# Altium footprint library mastermind.PCBLIB: 1061 footprints (part 65 of 67)
Each footprint in its own frame and in the unit in brackets; x right, y up, seen from the top. Pads: shape width x height; smd on the part's side, far side on the other; paste and mask are expansions set on the pad; w line width, h text height; cw(c..) or ccw(c..) is an arc to the next point about the centre after c.
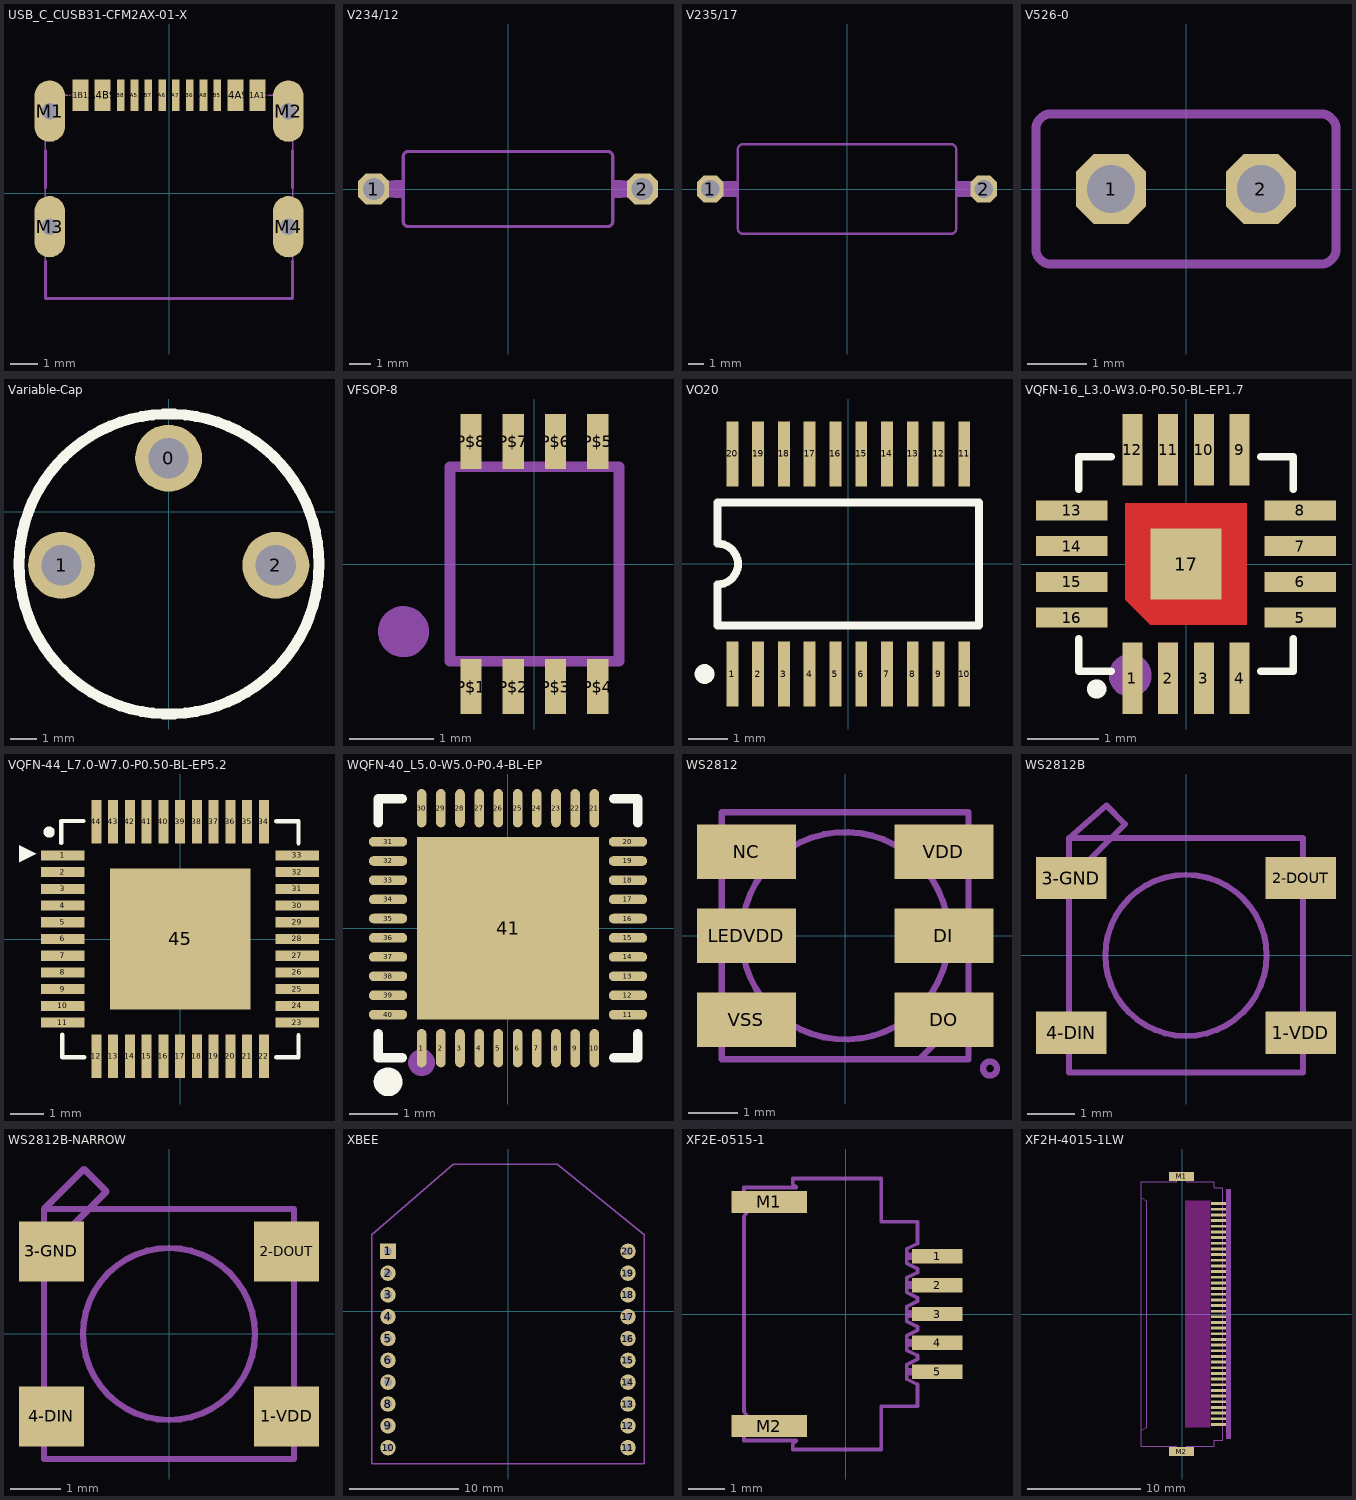
[diagram p64: the footprints below, top view; thin cyan lines are the x and y axes]

## USB_C_CUSB31-CFM2AX-01-X [mm] "USB_C_CUSB31-CFM2AX-01-X"
pads (16):
  rect 0.575x1.15 smd: A1B12(-3.2,3.545) A4B9(-2.4,3.545) B1A12(3.2,3.545) B4A9(2.4,3.545)
  rect 0.275x1.15 smd: A5(-1.25,3.545) A6(-0.25,3.545) A7(0.25,3.545) A8(1.25,3.545) B5(1.75,3.545) B6(0.75,3.545) B7(-0.75,3.545) B8(-1.75,3.545)
  oval 1.108x2.216 hole 0.6: M1(-4.32,2.97) M2(4.32,2.97) M3(-4.32,-1.21) M4(4.32,-1.21)
Top Paste:
  region: -4.826,2.489 -4.826,3.454 -4.826,3.555 -4.749,3.742 -4.606,3.885 -4.419,3.962 -4.318,3.962 -4.222,3.962 -4.045,3.889 -3.909,3.753 -3.835,3.576 -3.835,3.48 -3.835,2.464 -3.835,2.368 -3.909,2.19 -4.045,2.055 -4.222,1.981 -4.318,1.981 -4.419,1.981 -4.606,2.059 -4.749,2.201 -4.826,2.388
  region: 3.823,2.502 3.823,3.467 3.823,3.568 3.9,3.755 4.043,3.898 4.23,3.975 4.331,3.975 4.427,3.975 4.604,3.902 4.74,3.766 4.813,3.588 4.813,3.492 4.813,2.476 4.813,2.381 4.74,2.203 4.604,2.067 4.427,1.994 4.331,1.994 4.23,1.994 4.043,2.071 3.9,2.214 3.823,2.401
  region: 3.823,-1.689 3.823,-0.724 3.823,-0.623 3.9,-0.436 4.043,-0.293 4.23,-0.216 4.331,-0.216 4.427,-0.216 4.604,-0.289 4.74,-0.425 4.813,-0.603 4.813,-0.699 4.813,-1.714 4.813,-1.81 4.74,-1.988 4.604,-2.124 4.427,-2.197 4.331,-2.197 4.23,-2.197 4.043,-2.12 3.9,-1.977 3.823,-1.79
  region: -4.813,-1.689 -4.813,-0.724 -4.813,-0.623 -4.736,-0.436 -4.593,-0.293 -4.406,-0.216 -4.305,-0.216 -4.209,-0.216 -4.032,-0.289 -3.896,-0.425 -3.823,-0.603 -3.823,-0.699 -3.823,-1.714 -3.823,-1.81 -3.896,-1.988 -4.032,-2.124 -4.209,-2.197 -4.305,-2.197 -4.406,-2.197 -4.593,-2.12 -4.736,-1.977 -4.813,-1.79
Mechanical 3:
  lines w0.05: -3.53,3.54 -4.47,3.54 -4.47,-3.81 4.47,-3.81 4.47,3.54 3.53,3.54
Dimensions:
  lines w0.102: -4.47,-2.46 -4.47,-3.81 4.47,-3.81 4.47,-2.46 ; -4.47,0.19 -4.47,1.54 ; 4.47,0.19 4.47,1.54
Route Tool Path (Mech28):
  lines w0: -4.62,-1.51 ccw(c-4.32,-1.51) -4.32,-1.81 ccw(c-4.32,-1.51) -4.02,-1.51 -4.02,-0.91 ccw(c-4.32,-0.91) -4.32,-0.61 ccw(c-4.32,-0.91) -4.62,-0.91 -4.62,-1.51 ; -4.62,2.42 ccw(c-4.32,2.42) -4.32,2.12 ccw(c-4.32,2.42) -4.02,2.42 -4.02,3.52 ccw(c-4.32,3.52) -4.32,3.82 ccw(c-4.32,3.52) -4.62,3.52 -4.62,2.42 ; 4.02,-1.51 ccw(c4.32,-1.51) 4.32,-1.81 ccw(c4.32,-1.51) 4.62,-1.51 4.62,-0.91 ccw(c4.32,-0.91) 4.32,-0.61 ccw(c4.32,-0.91) 4.02,-0.91 4.02,-1.51 ; 4.02,2.42 ccw(c4.32,2.42) 4.32,2.12 ccw(c4.32,2.42) 4.62,2.42 4.62,3.52 ccw(c4.32,3.52) 4.32,3.82 ccw(c4.32,3.52) 4.02,3.52 4.02,2.42
3D body "USB Type C Port (SMD Type).STEP": height 3.18, standoff -1.02, extent -4.45,-3.8 4.49,4.1

## V234/12 [mil]
pads (2):
  oct 58.09x58.09 hole 40: 1(-250,0) 2(250,0)
Mechanical 2:
  region: -213,-16 -213,16 -195,16 -195,-16
  region: 195,-16 195,16 213,16 213,-16
  lines w6: -195,-60 ccw(c-185,-60) -185,-70 185,-70 ccw(c185,-60) 195,-60 195,60 ccw(c185,60) 185,70 -185,70 ccw(c-185,60) -195,60 -195,-60
Mechanical 8:
  lines w32: -250,0 -215,0 ; 215,0 250,0

## V235/17 [mil]
pads (2):
  oct 68.26x68.26 hole 47: 1(-350,0) 2(350,0)
Mechanical 2:
  region: -305,-20 -305,20 -280,20 -280,-20
  region: 280,-20 280,20 305,20 305,-20
  lines w6: -280,-100 ccw(c-265,-100) -265,-115 265,-115 ccw(c265,-100) 280,-100 280,100 ccw(c265,100) 265,115 -265,115 ccw(c-265,100) -280,100 -280,-100
Mechanical 8:
  lines w40: -350,0 -310,0 ; 310,0 350,0

## V526-0 [mil]
pads (2):
  oct 46.48x46.48 hole 32: 1(-50,0) 2(50,0)
Mechanical 2:
  lines w6: -100,-40 ccw(c-90,-40) -90,-50 90,-50 ccw(c90,-40) 100,-40 100,40 ccw(c90,40) 90,50 -90,50 ccw(c-90,40) -100,40 -100,-40

## Variable-Cap [mm]
pads (3):
  round 2.5 hole 1.5: 0(0,2) 1(-4,-2) 2(4,-2)
Top Overlay:
  circle w0.4: c0.013,-1.951 r5.6
3D body "User Library-spectrol pot-1.step": height 25.76, standoff -3.69, extent -6.352,-8.34 6.379,4.391

## VFSOP-8 [mm]
pads (8):
  rect 0.25x0.65 smd: P$1(-0.75,-1.45) P$2(-0.25,-1.45) P$3(0.25,-1.45) P$4(0.75,-1.45) P$5(0.75,1.45) P$6(0.25,1.45) P$7(-0.25,1.45) P$8(-0.75,1.45)
Mechanical 2:
  circle w0.305: c-1.55,-0.8 r0.15
  lines w0.127: -1,-1.15 -1,1.15 ; 1,-1.15 1,1.15
Mechanical 8:
  region: -0.85,1.15 -0.85,1.55 -0.65,1.55 -0.65,1.15
  region: -0.35,1.15 -0.35,1.55 -0.15,1.55 -0.15,1.15
  region: 0.15,1.15 0.15,1.55 0.35,1.55 0.35,1.15
  region: 0.65,1.15 0.65,1.55 0.85,1.55 0.85,1.15
  region: 0.65,-1.55 0.65,-1.15 0.85,-1.15 0.85,-1.55
  region: 0.15,-1.55 0.15,-1.15 0.35,-1.15 0.35,-1.55
  region: -0.85,-1.55 -0.85,-1.15 -0.65,-1.15 -0.65,-1.55
  region: -0.35,-1.55 -0.35,-1.15 -0.15,-1.15 -0.15,-1.55
  lines w0.127: -1,-1.15 -1,1.15 1,1.15 1,-1.15 -1,-1.15

## VO20 [mm]
pads (20):
  rect 0.3x1.65 smd: 1(-2.929,-2.778) 2(-2.279,-2.778) 3(-1.629,-2.778) 4(-0.979,-2.778) 5(-0.329,-2.778) 6(0.321,-2.778) 7(0.971,-2.778) 8(1.621,-2.778) 9(2.271,-2.778) 10(2.921,-2.778) 11(2.921,2.772) 12(2.271,2.772) 13(1.621,2.772) 14(0.971,2.772) 15(0.321,2.772) 16(-0.329,2.772) 17(-0.979,2.772) 18(-1.629,2.772) 19(-2.279,2.772) 20(-2.929,2.772)
Top Overlay:
  circle w0.25: c-3.629,-2.778 r0.125
  lines w0.2: -3.304,-1.553 -3.304,-0.519 ccw(c-3.304,-0.003) -3.304,0.514 -3.304,1.547 3.296,1.547 3.296,-1.553 -3.304,-1.553
3D body: height 1.52, standoff 0, extent -3.302,-1.524 3.302,1.524
3D body: height 0.51, standoff 0, extent 2.794,-3.556 3.048,-1.524
3D body: height 0.51, standoff 0, extent 2.144,-3.556 2.398,-1.524
3D body: height 0.51, standoff 0, extent 1.494,-3.556 1.748,-1.524
3D body: height 0.51, standoff 0, extent 0.844,-3.556 1.098,-1.524
3D body: height 0.51, standoff 0, extent 0.194,-3.556 0.448,-1.524
3D body: height 0.51, standoff 0, extent -0.456,-3.556 -0.202,-1.524
3D body: height 0.51, standoff 0, extent -1.106,-3.556 -0.852,-1.524
3D body: height 0.51, standoff 0, extent -1.756,-3.556 -1.502,-1.524
3D body: height 0.51, standoff 0, extent -2.406,-3.556 -2.152,-1.524
3D body: height 0.51, standoff 0, extent -3.056,-3.556 -2.802,-1.524
3D body: height 0.51, standoff 0, extent -3.055,1.519 -2.801,3.551
3D body: height 0.51, standoff 0, extent -2.405,1.519 -2.151,3.551
3D body: height 0.51, standoff 0, extent -1.755,1.519 -1.501,3.551
3D body: height 0.51, standoff 0, extent -1.105,1.519 -0.851,3.551
3D body: height 0.51, standoff 0, extent -0.455,1.519 -0.201,3.551
3D body: height 0.51, standoff 0, extent 0.195,1.519 0.449,3.551
3D body: height 0.51, standoff 0, extent 0.845,1.519 1.099,3.551
3D body: height 0.51, standoff 0, extent 1.495,1.519 1.749,3.551
3D body: height 0.51, standoff 0, extent 2.145,1.519 2.399,3.551
3D body: height 0.51, standoff 0, extent 2.795,1.519 3.049,3.551

## VQFN-16_L3.0-W3.0-P0.50-BL-EP1.7 [mm]
pads (17):
  rect 0.28x1 smd paste-100 mask+0.051: 1(-0.749,-1.6) 2(-0.249,-1.6) 3(0.249,-1.6) 4(0.749,-1.6) 9(0.749,1.6) 10(0.249,1.6) 11(-0.249,1.6) 12(-0.749,1.6)
  rect 1x0.28 smd paste-100 mask+0.051: 5(1.6,-0.749) 6(1.6,-0.249) 7(1.6,0.249) 8(1.6,0.749) 13(-1.6,0.749) 14(-1.6,0.249) 15(-1.6,-0.249) 16(-1.6,-0.749)
  rect 1x1 smd: 17(0,0)
Top Layer:
  region: -0.85,-0.5 -0.85,0.85 0.85,0.85 0.85,-0.85 -0.5,-0.85
Top Overlay:
  lines w0.102: -1.5,-1.044 -1.5,-1.5 -1.044,-1.5 ; -1.5,1.044 -1.5,1.5 -1.044,1.5 ; 1.044,-1.5 1.5,-1.5 1.5,-1.044 ; 1.044,1.5 1.5,1.5 1.5,1.044
  lines w0.25: -1.251,-1.74 ccw(c-1.25,-1.75) -1.249,-1.74
Top Paste:
  region: -0.85,-0.5 -0.85,0.85 0.85,0.85 0.85,-0.85 -0.5,-0.85
  region: -0.889,-1.1 -0.609,-1.1 -0.609,-2.1 -0.889,-2.1
  region: -0.389,-1.1 -0.109,-1.1 -0.109,-2.1 -0.389,-2.1
  region: 0.109,-1.1 0.389,-1.1 0.389,-2.1 0.109,-2.1
  region: 0.61,-1.1 0.89,-1.1 0.89,-2.1 0.61,-2.1
  region: -2.1,-0.609 -1.1,-0.609 -1.1,-0.889 -2.1,-0.889
  region: -2.1,-0.109 -1.1,-0.109 -1.1,-0.389 -2.1,-0.389
  region: -2.1,0.389 -1.1,0.389 -1.1,0.109 -2.1,0.109
  region: -2.1,0.889 -1.1,0.889 -1.1,0.609 -2.1,0.609
  region: -0.889,2.1 -0.609,2.1 -0.609,1.1 -0.889,1.1
  region: -0.389,2.1 -0.109,2.1 -0.109,1.1 -0.389,1.1
  region: 0.109,2.1 0.389,2.1 0.389,1.1 0.109,1.1
  region: 0.61,2.1 0.89,2.1 0.89,1.1 0.61,1.1
  region: 1.1,0.889 2.1,0.889 2.1,0.609 1.1,0.609
  region: 1.1,0.389 2.1,0.389 2.1,0.109 1.1,0.109
  region: 1.1,-0.109 2.1,-0.109 2.1,-0.389 1.1,-0.389
  region: 1.1,-0.609 2.1,-0.609 2.1,-0.889 1.1,-0.889
Top Solder:
  region: -0.85,-0.5 -0.85,0.85 0.85,0.85 0.85,-0.85 -0.5,-0.85
Mechanical 15:
  circle w0.3: c-0.78,-1.56 r0.15
3D body: height 0.55, standoff 0, extent -1.152,-1.153 -1.048,-1.048
3D body: height 0.5, standoff 0, extent -1.5,-1.5 1.5,1.5

## VQFN-44_L7.0-W7.0-P0.50-BL-EP5.2 [mm]
pads (45):
  rect 1.3x0.3 smd: 1(-3.5,2.5) 2(-3.5,2) 3(-3.5,1.5) 4(-3.5,1) 5(-3.5,0.5) 6(-3.5,0) 7(-3.5,-0.5) 8(-3.5,-1) 9(-3.5,-1.5) 10(-3.5,-2) 11(-3.5,-2.5) 23(3.5,-2.5) 24(3.5,-2) 25(3.5,-1.5) 26(3.5,-1) 27(3.5,-0.5) 28(3.5,0) 29(3.5,0.5) 30(3.5,1) 31(3.5,1.5) 32(3.5,2) 33(3.5,2.5)
  rect 0.3x1.3 smd: 12(-2.5,-3.5) 13(-2,-3.5) 14(-1.5,-3.5) 15(-1,-3.5) 16(-0.5,-3.5) 17(0,-3.5) 18(0.5,-3.5) 19(1,-3.5) 20(1.5,-3.5) 21(2,-3.5) 22(2.5,-3.5) 34(2.5,3.5) 35(2,3.5) 36(1.5,3.5) 37(1,3.5) 38(0.5,3.5) 39(0,3.5) 40(-0.5,3.5) 41(-1,3.5) 42(-1.5,3.5) 43(-2,3.5) 44(-2.5,3.5)
  rect 4.2x4.2 smd: 45(0,0)
Top Overlay:
  circle w0.254: c-3.912,3.196 r0.04
  region: -4.813,2.798 -4.813,2.29 -4.305,2.544
  lines w0.127: -3.55,2.866 -3.55,3.522 -2.883,3.522 ; -3.522,-2.864 -3.522,-3.532 -2.865,-3.532 ; 2.873,-3.532 3.54,-3.532 3.54,-2.875 ; 2.873,3.519 3.54,3.519 3.54,2.862
Top Paste:
  drawing of 45 lines, arcs and shapes, not listed
3D body "User Library-QFN 44.STEP": height 0.8, standoff -0.05, extent -3.507,-3.51 3.495,3.492

## WQFN-40_L5.0-W5.0-P0.4-BL-EP [mm]
pads (41):
  oval 0.2x0.8 smd paste-100 mask+0.051: 1(-1.801,-2.499) 2(-1.399,-2.499) 3(-1.001,-2.499) 4(-0.599,-2.499) 5(-0.201,-2.499) 6(0.201,-2.499) 7(0.6,-2.499) 8(1.001,-2.499) 9(1.4,-2.499) 10(1.801,-2.499) 21(1.801,2.499) 22(1.4,2.499) 23(1.001,2.499) 24(0.6,2.499) 25(0.201,2.499) 26(-0.201,2.499) 27(-0.599,2.499) 28(-1.001,2.499) 29(-1.399,2.499) 30(-1.801,2.499)
  oval 0.8x0.2 smd paste-100 mask+0.051: 11(2.499,-1.801) 12(2.499,-1.4) 13(2.499,-1.001) 14(2.499,-0.6) 15(2.499,-0.201) 16(2.499,0.201) 17(2.499,0.599) 18(2.499,1.001) 19(2.499,1.399) 20(2.499,1.801) 31(-2.499,1.801) 32(-2.499,1.399) 33(-2.499,1.001) 34(-2.499,0.599) 35(-2.499,0.201) 36(-2.499,-0.201) 37(-2.499,-0.6) 38(-2.499,-1.001) 39(-2.499,-1.4) 40(-2.499,-1.801)
  rect 3.8x3.8 smd paste-100 mask+0.051: 41(0,0)
Top Overlay:
  lines w0.2: -2.7,-2.2 -2.7,-2.7 -2.2,-2.7 ; -2.7,2.2 -2.7,2.7 -2.2,2.7 ; 2.2,-2.7 2.7,-2.7 2.7,-2.2 ; 2.2,2.7 2.7,2.7 2.7,2.2
  lines w0.3: -2.499,-3.051 ccw(c-2.498,-3.201) -2.497,-3.051
Top Paste:
  drawing of 41 lines, arcs and shapes, not listed
Mechanical 15:
  circle w0.28: c-1.8,-2.8 r0.14

## WS2812 [mm]
pads (6):
  rect 2x1.1 smd: DI(2,0) DO(2,-1.7) LEDVDD(-2,0) NC(-2,1.7) VDD(2,1.7) VSS(-2,-1.7)
Mechanical 2:
  circle w0.127: c0,0 r2.1
  circle w0.127: c2.934,-2.688 r0.141
  lines w0.127: 1.5,-2.5 2.5,-1.5 ; 1.5,-2.5 -2.5,-2.5 -2.5,2.5 2.5,2.5 2.5,-1.5 ; 1.5,-2.5 2.5,-2.5 2.5,-1.5

## WS2812B [mm]
pads (4):
  rect 1.5x0.9 smd: 1-VDD(2.45,-1.65) 2-DOUT(2.45,1.65) 3-GND(-2.45,1.65) 4-DIN(-2.45,-1.65)
Mechanical 2:
  circle w0.127: c0,0 r1.72
  lines w0.127: -2.5,1.6 -1.6,2.5 ; -2.5,1.6 -2.5,2.5 ; -2.5,1.6 -2.5,-2.5 2.5,-2.5 2.5,2.5 -1.6,2.5 ; -2.5,2.5 -1.7,3.2 -1.3,2.8 -1.6,2.5 ; -2.5,2.5 -1.6,2.5

## WS2812B-NARROW [mm]
pads (4):
  rect 1.3x1.2 smd: 1-VDD(2.35,-1.65) 2-DOUT(2.35,1.65) 3-GND(-2.35,1.65) 4-DIN(-2.35,-1.65)
Mechanical 2:
  circle w0.127: c0,0 r1.72
  lines w0.127: -2.5,1.6 -2.5,-2.5 2.5,-2.5 2.5,2.5 -1.6,2.5 ; -2.5,1.6 -2.5,2.5 ; -2.5,1.6 -1.6,2.5 ; -2.5,2.5 -1.6,2.5 ; -2.5,2.5 -1.7,3.3 -1.25,2.85 -1.6,2.5

## XBEE [mil]
pads (20):
  rect 56x56 hole 27.56: 1(-433.07,216.54)
  round 56 hole 27.56: 2(-433.07,137.8) 3(-433.07,59.06) 4(-433.07,-19.69) 5(-433.07,-98.43) 6(-433.07,-177.17) 7(-433.07,-255.91) 8(-433.07,-334.65) 9(-433.07,-413.39) 10(-433.07,-492.13) 11(433.07,-492.13) 12(433.07,-413.39) 13(433.07,-334.65) 14(433.07,-255.91) 15(433.07,-177.17) 16(433.07,-98.43) 17(433.07,-19.69) 18(433.07,59.06) 19(433.07,137.8) 20(433.07,216.54)
Mechanical 2:
  lines w5: -492.13,-551.18 492.13,-551.18 492.13,275.59 177.17,531.5 -196.85,531.5 -492.13,275.59 -492.13,-551.18

## XF2E-0515-1 [mil]
pads (7):
  rect 55.12x15.75 smd: 1(100,62.99) 2(100,31.5) 3(100,0) 4(100,-31.5) 5(100,-62.99)
  rect 82.68x23.62 smd: M1(-83.07,122.05) M2(-83.07,-122.05)
Mechanical 2:
  lines w4: -110.63,-137.8 -53.54,-137.8 -57.48,-141.73 -57.48,-147.64 38.98,-147.64 38.98,-100.39 78.35,-100.39 78.35,-76.77 66.54,-70.87 66.54,-55.12 78.35,-49.21 78.35,-45.28 66.54,-39.37 66.54,-23.62 78.35,-17.72 78.35,-13.78 66.54,-7.87 66.54,7.87 78.35,13.78 78.35,17.72 66.54,23.62 66.54,39.37 78.35,45.28 78.35,49.21 66.54,55.12 66.54,70.87 78.35,76.77 78.35,100.39 38.98,100.39 38.98,147.64 -57.48,147.64 -57.48,141.73 -53.54,137.8 -110.63,137.8 ; -110.63,-106.3 -110.63,106.3
Mechanical 8:
  region: 68.5,-66.93 68.5,-59.06 107.87,-59.06 107.87,-66.93
  region: 68.5,-35.43 68.5,-27.56 107.87,-27.56 107.87,-35.43
  region: 68.5,-3.94 68.5,3.94 107.87,3.94 107.87,-3.94
  region: 68.5,27.56 68.5,35.43 107.87,35.43 107.87,27.56
  region: 68.5,59.06 68.5,66.93 107.87,66.93 107.87,59.06
  lines w4: -110.63,-137.8 -110.63,-116.14 -102.76,-116.14 -110.63,-106.3 ; -110.63,106.3 -102.76,116.14 -110.63,116.14 -110.63,137.8

## XF2H-4015-1LW [mil]
pads (42):
  rect 51.18x9.84 smd mask-25.59: 1(125,383.86) 2(125,364.17) 3(125,344.49) 4(125,324.8) 5(125,305.12) 6(125,285.43) 7(125,265.75) 8(125,246.06) 9(125,226.38) 10(125,206.69) 11(125,187.01) 12(125,167.32) 13(125,147.64) 14(125,127.95) 15(125,108.27) 16(125,88.58) 17(125,68.9) 18(125,49.21) 19(125,29.53) 20(125,9.84) 21(125,-9.84) 22(125,-29.53) 23(125,-49.21) 24(125,-68.9) 25(125,-88.58) 26(125,-108.27) 27(125,-127.95) 28(125,-147.64) 29(125,-167.32) 30(125,-187.01) 31(125,-206.69) 32(125,-226.38) 33(125,-246.06) 34(125,-265.75) 35(125,-285.43) 36(125,-305.12) 37(125,-324.8) 38(125,-344.49) 39(125,-364.17) 40(125,-383.86)
  rect 86.61x31.5 smd: M1(-2.95,478.35) M2(-2.95,-478.35)
Top Layer keep-out:
  region: 8.86,-393.7 8.86,393.7 97.44,393.7 97.44,-393.7
Top Solder:
  drawing of 40 lines, arcs and shapes, not listed
Mechanical 2:
  lines w4: -52.17,-460.63 -142.72,-460.63 -142.72,-403.54 ; -52.17,460.63 -142.72,460.63 -142.72,403.54 ; 46.26,-460.63 111.22,-460.63 111.22,-438.98 140.75,-438.98 140.75,-393.7 ; 46.26,460.63 111.22,460.63 111.22,438.98 140.75,438.98 140.75,393.7 ; -142.72,-403.54 -142.72,403.54 ; -142.72,-403.54 -125,-393.7 -125,393.7 -142.72,403.54
Mechanical 8:
  lines w4: -52.17,-460.63 -20.67,-460.63 -20.67,-472.44 14.76,-472.44 14.76,-460.63 46.26,-460.63 ; -52.17,460.63 -20.67,460.63 -20.67,472.44 14.76,472.44 14.76,460.63 46.26,460.63 ; 140.75,-393.7 140.75,393.7
Mechanical 29 (Mech34):
  region: 152.56,-433.07 152.56,433.07 167.32,433.07 167.32,-433.07